# Altium footprint library Connectors.PcbLib: 245 footprints (part 14 of 18)
Each footprint in its own frame and in the unit in brackets; x right, y up, seen from the top. Pads: shape width x height; smd on the part's side, far side on the other; paste and mask are expansions set on the pad; w line width, h text height; cw(c..) or ccw(c..) is an arc to the next point about the centre after c.
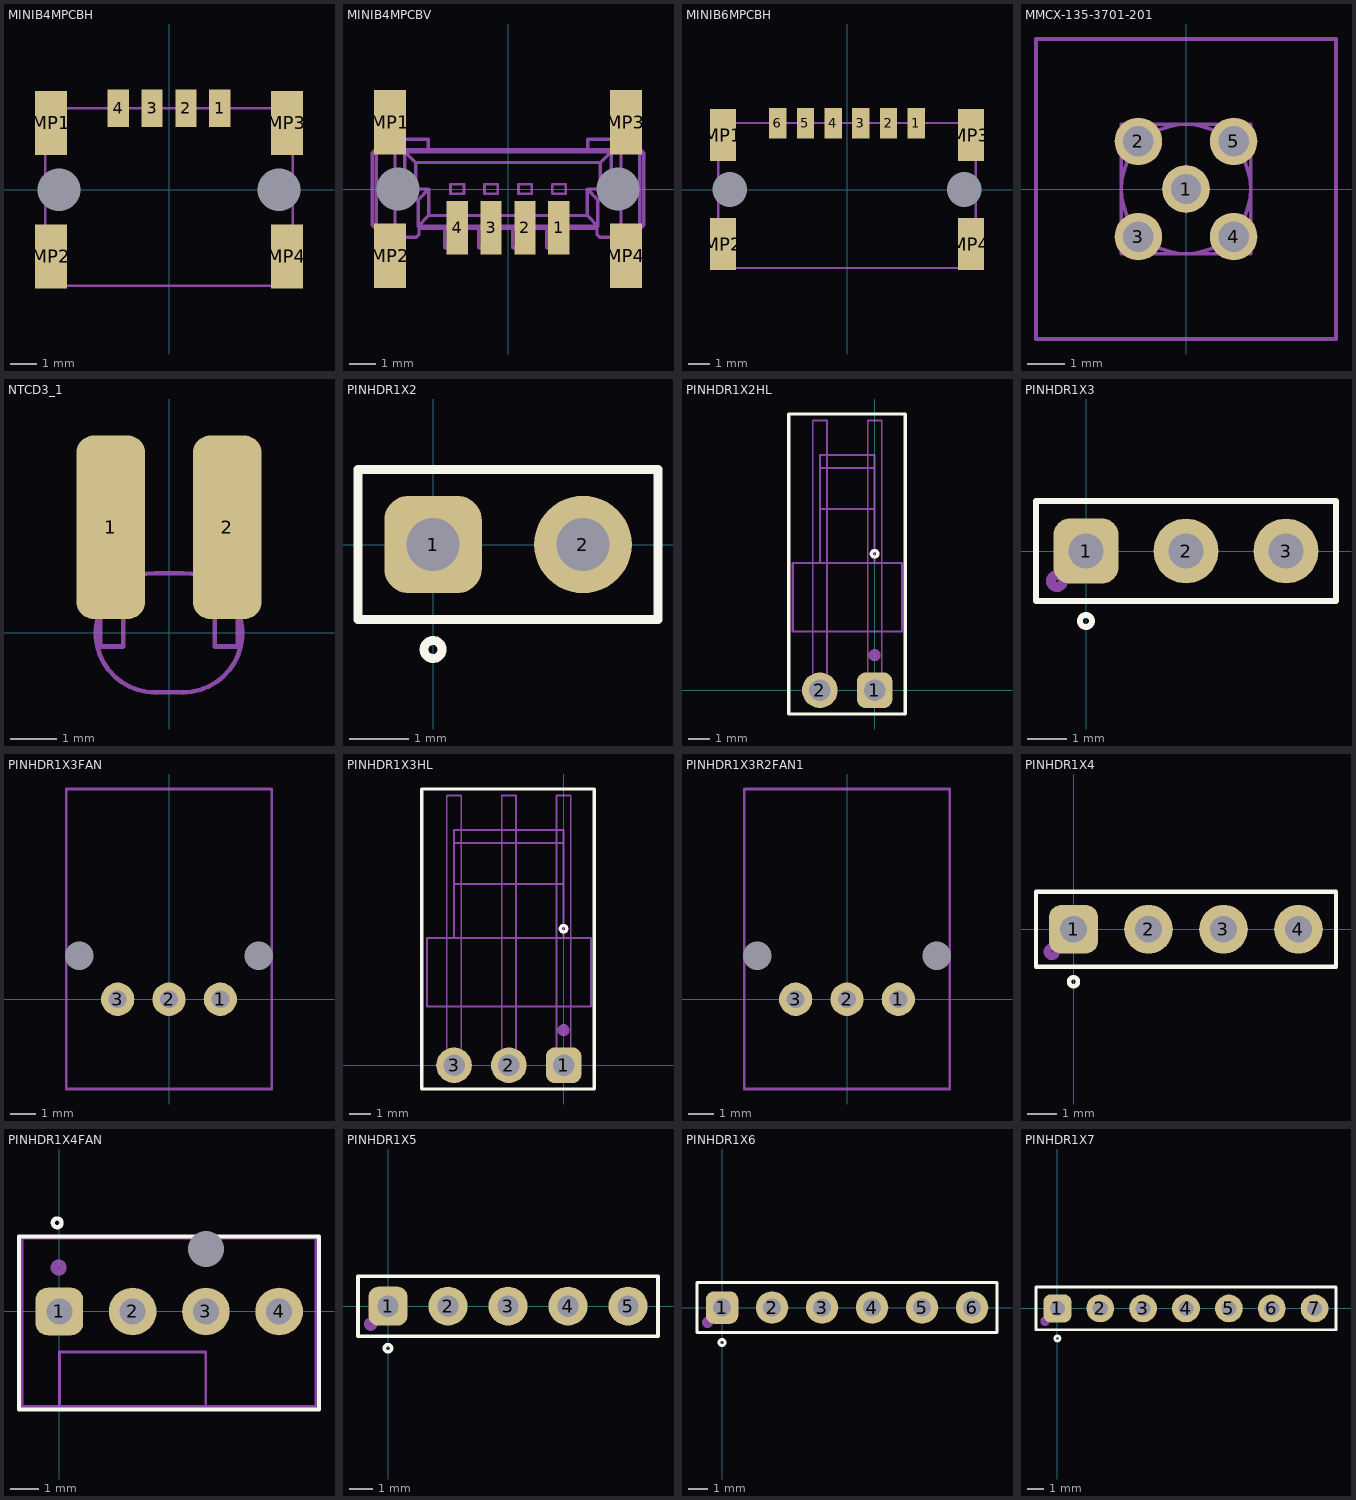
[diagram p13: the footprints below, top view; thin cyan lines are the x and y axes]

## MINIB4MPCBH [mm] "MiniBridge 4 pin MALE HORIZONTAL"
height 3
pads (10):
  rect 0.8x1.4 smd: 1(1.905,3.05) 2(0.635,3.05) 3(-0.635,3.05) 4(-1.905,3.05)
  rect 0x0 hole 1.6 unplated: MH1(-4.115,0) MH2(4.115,0)
  rect 1.2x2.4 smd: MP1(-4.415,2.5) MP2(-4.415,-2.5) MP3(4.415,2.5) MP4(4.415,-2.5)
Mechanical 13:
  lines w0.102: -4.635,-3.6 4.635,-3.6 4.635,3.05 -4.635,3.05 -4.635,-3.6
3D body: height 3, standoff -0.73, extent -5.08,-3.6 5.08,3.6

## MINIB4MPCBV [mm] "MiniBridge 4 pin MALE vertical"
height 8
pads (10):
  rect 0.8x2 smd: 1(1.905,-1.45) 2(0.635,-1.45) 3(-0.635,-1.45) 4(-1.905,-1.45)
  rect 0x0 hole 1.6 unplated: MH1(-4.115,0) MH2(4.115,0)
  rect 1.2x2.4 smd: MP1(-4.415,2.5) MP2(-4.415,-2.5) MP3(4.415,2.5) MP4(4.415,-2.5)
Mechanical 13:
  drawing of 218 lines, arcs and shapes, not listed
3D body: height 5.27, standoff -0.73, extent -5.08,-3.6 5.08,3.6

## MINIB6MPCBH [mm] "MiniBridge 6 pin MALE HORIZONTAL"
height 3
pads (12):
  rect 0.8x1.4 smd: 1(3.175,3.05) 2(1.905,3.05) 3(0.635,3.05) 4(-0.635,3.05) 5(-1.905,3.05) 6(-3.175,3.05)
  rect 0x0 hole 1.6 unplated: MH1(-5.385,0) MH2(5.385,0)
  rect 1.2x2.4 smd: MP1(-5.685,2.5) MP2(-5.685,-2.5) MP3(5.685,2.5) MP4(5.685,-2.5)
Mechanical 13:
  lines w0.102: -5.905,-3.6 -5.905,3.05 5.905,3.05 5.905,-3.6 -5.905,-3.6

## MMCX-135-3701-201 [mil] "MMCX Jack, PCB Vertical"
height 177
pads (5):
  round 50 hole 32: 1(0,0) 2(-50,50) 3(-50,-50) 4(50,-50) 5(50,50)
Mechanical 13:
  circle w20: c0,0 r10
  circle w4: c0,0 r68
  lines w3.94: -68,-68 68,-68 68,68 -68,68 -68,-68
Mechanical 15:
  lines w4: -21.65,0 21.65,0 ; 0,-23.62 0,23.62 ; -157.48,-157.48 157.48,-157.48 157.48,157.48 -157.48,157.48 -157.48,-157.48
3D body: height 177.65, standoff -117.63, extent -68.88,-68.89 68.91,68.91

## NTCD3_1 [mm] "NTC resistor SMD R2.54mm 2.4x3mm h 8mm"
height 8
pads (2):
  rrect50% 1.5x4 smd: 1(-1.27,2.3) 2(1.27,2.3)
Mechanical 13:
  lines w0.1: -0.3,-1.3 0.3,-1.3 ; -0.3,1.3 0.3,1.3
  lines w0.102: -0.3,-1.3 cw(c-0.3,0) -0.3,1.3 ; 0.3,-1.3 ccw(c0.3,0) 0.3,1.3 ; -1.5,-0.3 -1,-0.3 -1,3.7 -1.5,3.7 -1.5,-0.3 ; 1,-0.3 1,3.7 1.5,3.7 1.5,-0.3 1,-0.3
3D body: height 6, standoff 2, extent -1.611,-1.311 1.611,1.311
3D body: height 0.5, standoff 0, extent -1.5,-0.3 -1,3.7
3D body: height 0.5, standoff 0, extent 1,-0.3 1.5,3.7
3D body: height 2, standoff 0, extent -1.5,-0.3 -1,0.2
3D body: height 2, standoff 0, extent 1,-0.3 1.5,0.2

## PINHDR1X2 [mil] "Pin header 1x2 pin R2.54mm"
height 433.07
pads (2):
  rrect50% 65x65 hole 35.43 paste-50: 1(0,0)
  round 65 hole 35.43 paste-50: 2(100,0)
Top Overlay:
  circle w5.91: c0,-70 r6
  lines w5.91: -50,-50 -50,50 150,50 150,-50 -50,-50
Mechanical 13:
  lines w4: -50,-50 -50,50 150,50 150,-50 -50,-50 ; -13,-13 13,-13 13,13 -13,13 -13,-13 ; 87,-13 113,-13 113,13 87,13 87,-13
3D body: height 314.96, standoff -125.98, extent -13,-13 13,13
3D body: height 314.96, standoff -125.98, extent 87,-13 113,13
3D body: height 100, standoff 0, extent -50,-50 150,50

## PINHDR1X2HL [mil] "Pin header 1x2 pin R2.54mm Molex 22-05-3021"
height 250
pads (2):
  rrect50% 65x65 hole 39.37 paste-50: 1(0,0)
  round 65 hole 39.37 paste-50: 2(-100,0)
Top Overlay:
  circle w5.91: c-0.29,249.02 r6
  lines w5.91: -157,-43.31 55.91,-43.31 55.91,503.94 -157,503.94 -157,-43.31
Mechanical 13:
  circle w10: c-0.29,63.98 r6
  lines w3: -113,13 -113,492.13 -87,492.13 -87,13 ; -100,330.71 -0.2,330.71 ; -100,405.51 -0.2,405.51 ; -13,13 -13,492.13 13,492.13 13,13
  lines w4: -100,232.08 -100,429.13 -0.2,429.13 -0.2,232.08 ; -149.61,107.08 -149.61,232.08 49.61,232.08 49.61,107.08 -149.61,107.08 ; -113,-13 -113,13 -87,13 -87,-13 -113,-13 ; -13,-13 -13,13 13,13 13,-13 -13,-13
3D body: height 250, standoff 0, extent -149.61,107.08 49.61,232.08
3D body: height 135.04, standoff -140.94, extent -113,-13 -87,13
3D body: height 135.04, standoff -140.94, extent -13,-13 13,13
3D body: height 210.63, standoff 177.17, extent -100,330.71 -0.2,405.51
3D body: height 250, standoff 210.63, extent -100,232.08 -0.2,429.13
3D body: height 135.04, standoff 109.06, extent -113,13 -87,492.13
3D body: height 135.04, standoff 109.06, extent -13,13 13,492.13

## PINHDR1X3 [mil] "Pin header 1x3 pin R2.54mm"
height 433.07
pads (3):
  rrect50% 65x65 hole 35.43 paste-50: 1(0,0)
  round 65 hole 35.43 paste-50: 2(100,0) 3(200,0)
Top Overlay:
  circle w5.91: c0,-70 r6
  lines w5.91: -50,-50 250,-50 250,50 -50,50 -50,-50
Mechanical 13:
  circle w10: c-29,-30 r6
  lines w4: -50,-50 250,-50 250,50 -50,50 -50,-50 ; -13,-13 13,-13 13,13 -13,13 -13,-13 ; 87,-13 113,-13 113,13 87,13 87,-13 ; 187,-13 213,-13 213,13 187,13 187,-13
3D body: height 100, standoff 0, extent -50,-50 250,50
3D body: height 314.96, standoff -125.98, extent 87,-13 113,13
3D body: height 314.96, standoff -125.98, extent -13,-13 13,13
3D body: height 314.96, standoff -125.98, extent 187,-13 213,13

## PINHDR1X3FAN [mm] "Pin header 1x3 pin R2.0mm FAN"
height 7
pads (5):
  round 1.3 hole 0.7: 1(2,0) 2(0,0) 3(-2,0)
  round 0 hole 1.1 unplated mask+0.7: MH1(3.5,1.7) MH2(-3.5,1.7)
Mechanical 13:
  lines w0.102: -4,-3.5 -4,8.2 4,8.2 4,-3.5 -4,-3.5
3D body: height 2.5, standoff 0, extent -4,-3.5 4,8.2
3D body: height 6, standoff 2.5, extent -4,-0.584 4,8.2
3D body: height 6.5, standoff 6, extent -4,-0.584 4,8.2
3D body: height 4, standoff 3, extent -2.324,2.286 -1.689,7.62
3D body: height 4, standoff 3, extent -0.324,2.286 0.311,7.62
3D body: height 4, standoff 3, extent 1.676,2.286 2.311,7.62
3D body: height 0, standoff -3.4, extent -2.343,-0.337 -1.67,0.337
3D body: height 0, standoff -3.4, extent -0.343,-0.337 0.33,0.337
3D body: height 0, standoff -3.4, extent 1.657,-0.337 2.33,0.337
3D body: height 0, standoff -1.2, extent -4.01,1.184 -2.987,2.194

## PINHDR1X3HL [mil] "Pin header 1x3 pin R2.54mm Molex 22-05-3031"
height 250
pads (3):
  rrect50% 65x65 hole 39.37 paste-50: 1(0,0)
  round 65 hole 39.37 paste-50: 2(-100,0) 3(-200,0)
Top Overlay:
  circle w5.91: c-0.29,249.02 r6
  lines w5.91: -259.06,-43.31 55.91,-43.31 55.91,503.94 -259.06,503.94 -259.06,-43.31
Mechanical 13:
  circle w10: c-0.29,63.98 r6
  lines w3: -213,13 -213,492.13 -187,492.13 -187,13 ; -200,330.71 -0.2,330.71 ; -200,405.51 -0.2,405.51 ; -113,13 -113,492.13 -87,492.13 -87,13 ; -13,13 -13,492.13 13,492.13 13,13
  lines w4: -200,232.08 -200,429.13 -0.2,429.13 -0.2,232.08 ; -249.61,107.08 -249.61,232.08 49.61,232.08 49.61,107.08 -249.61,107.08 ; -213,-13 -213,13 -187,13 -187,-13 -213,-13 ; -113,-13 -113,13 -87,13 -87,-13 -113,-13 ; -13,-13 -13,13 13,13 13,-13 -13,-13
3D body: height 250, standoff 0, extent -249.61,107.08 49.61,232.08
3D body: height 135.04, standoff -140.94, extent -113,-13 -87,13
3D body: height 135.04, standoff -140.94, extent -213,-13 -187,13
3D body: height 135.04, standoff -140.94, extent -13,-13 13,13
3D body: height 210.63, standoff 177.17, extent -200,330.71 -0.2,405.51
3D body: height 250, standoff 210.63, extent -200,232.08 -0.2,429.13
3D body: height 135.04, standoff 109.06, extent -213,13 -187,492.13
3D body: height 135.04, standoff 109.06, extent -113,13 -87,492.13
3D body: height 135.04, standoff 109.06, extent -13,13 13,492.13

## PINHDR1X3R2FAN1 [mm] "Pin header 1x3 pin R2.0mm FAN"
height 7.7
pads (5):
  round 1.3 hole 0.7: 1(2,0) 2(0,0) 3(-2,0)
  round 0 hole 1.1 unplated mask+0.7: MH1(3.5,1.7) MH2(-3.5,1.7)
Mechanical 13:
  lines w0.102: -4,-3.5 -4,8.2 4,8.2 4,-3.5 -4,-3.5
3D body: height 2.5, standoff 0, extent -4,-3.5 4,8.2
3D body: height 6, standoff 2.5, extent -4,-0.584 4,8.2
3D body: height 6.5, standoff 6, extent -4,-0.584 4,8.2
3D body: height 4, standoff 3, extent -2.324,2.286 -1.689,7.62
3D body: height 4, standoff 3, extent -0.324,2.286 0.311,7.62
3D body: height 4, standoff 3, extent 1.676,2.286 2.311,7.62
3D body: height 0, standoff -3.4, extent -2.343,-0.337 -1.67,0.337
3D body: height 0, standoff -3.4, extent -0.343,-0.337 0.33,0.337
3D body: height 0, standoff -3.4, extent 1.657,-0.337 2.33,0.337
3D body: height 0, standoff -1.2, extent -4.01,1.184 -2.987,2.194

## PINHDR1X4 [mil] "Pin header 1x4 pin R2.54mm"
height 433.07
pads (4):
  rrect50% 65x65 hole 35.43 paste-50: 1(0,0)
  round 65 hole 35.43 paste-50: 2(100,0) 3(200,0) 4(300,0)
Top Overlay:
  circle w5.91: c0,-70 r6
  lines w5.91: -50,-50 350,-50 350,50 -50,50 -50,-50
Mechanical 13:
  circle w10: c-29,-30 r6
  lines w4: -50,-50 350,-50 350,50 -50,50 -50,-50 ; -13,-13 -13,13 13,13 13,-13 -13,-13 ; 87,-13 87,13 113,13 113,-13 87,-13 ; 187,-13 187,13 213,13 213,-13 187,-13 ; 287,-13 287,13 313,13 313,-13 287,-13
3D body: height 100, standoff 0, extent -50,-50 350,50
3D body: height 314.96, standoff -125.98, extent 87,-13 113,13
3D body: height 314.96, standoff -125.98, extent -13,-13 13,13
3D body: height 314.96, standoff -125.98, extent 187,-13 213,13
3D body: height 314.96, standoff -125.98, extent 287,-13 313,13

## PINHDR1X4FAN [mil] "Pin header 1x4 pin R2.54mm Molex 47053-1000"
height 393.7
pads (5):
  rrect50% 65x65 hole 35.43 paste-50: 1(0,0)
  round 65 hole 35.43 paste-50: 2(100,0) 3(200,0) 4(300,0)
  round 0 hole 49.21 unplated mask+39.37: MH1(200,85.04)
Top Overlay:
  circle w5.91: c-3,121 r6
  lines w5.91: -55.12,-133.86 -55.12,102.36 354.33,102.36 354.33,-133.86 -55.12,-133.86
Mechanical 13:
  circle w10: c-1,60 r6
  lines w4: 0,-129.92 0,-55.12 199.8,-55.12 199.8,-129.92 ; -51.18,-129.92 -51.18,100.39 350.39,100.39 350.39,-129.92 -51.18,-129.92 ; -13,-13 13,-13 13,13 -13,13 -13,-13 ; 87,-13 113,-13 113,13 87,13 87,-13 ; 187,-13 213,-13 213,13 187,13 187,-13 ; 287,-13 313,-13 313,13 287,13 287,-13
  lines w5: 188.48,99.77 ccw(c200,85.04) 211.76,99.58
3D body: height 291.34, standoff 216.54, extent 0,-129.92 199.8,-55.12
3D body: height 393.7, standoff -137.8, extent 287,-13 313,13
3D body: height 393.7, standoff -137.8, extent 187,-13 213,13
3D body: height 393.7, standoff -137.8, extent -13,-13 13,13
3D body: height 393.7, standoff -137.8, extent 87,-13 113,13
3D body: height 100, standoff 0, extent -51.18,-129.92 350.39,100.39
3D body: height 0, standoff -90.55, extent 181,65.94 219,100.39
3D body: height 216.54, standoff 98.43, extent 0,-129.92 199.8,-94.49

## PINHDR1X5 [mil] "Pin header 1x6 pin R2.54mm"
height 433.07
pads (5):
  rrect50% 65x65 hole 35.43 paste-50: 1(0,0)
  round 65 hole 35.43 paste-50: 2(100,0) 3(200,0) 4(300,0) 5(400,0)
Top Overlay:
  circle w5.91: c0,-70 r6
  lines w5.91: -50,-50 -50,50 450,50 450,-50 -50,-50
Mechanical 13:
  circle w10: c-29,-30 r6
  lines w4: -50,-50 -50,50 450,50 450,-50 -50,-50 ; -13,-13 -13,13 13,13 13,-13 -13,-13 ; 87,-13 87,13 113,13 113,-13 87,-13 ; 187,-13 187,13 213,13 213,-13 187,-13 ; 287,-13 287,13 313,13 313,-13 287,-13 ; 387,-13 387,13 413,13 413,-13 387,-13
3D body: height 314.96, standoff -125.98, extent 387,-13 413,13
3D body: height 314.96, standoff -125.98, extent 287,-13 313,13
3D body: height 314.96, standoff -125.98, extent 187,-13 213,13
3D body: height 314.96, standoff -125.98, extent -13,-13 13,13
3D body: height 314.96, standoff -125.98, extent 87,-13 113,13
3D body: height 100, standoff 0, extent -50,-50 450,50

## PINHDR1X6 [mil] "Pin header 1x6 pin R2.54mm"
height 433.07
pads (6):
  rrect50% 65x65 hole 35.43 paste-50: 1(0,0)
  round 65 hole 35.43 paste-50: 2(100,0) 3(200,0) 4(300,0) 5(400,0) 6(500,0)
Top Overlay:
  circle w5.91: c0,-70 r6
  lines w5.91: -50,-50 -50,50 550,50 550,-50 -50,-50
Mechanical 13:
  circle w10: c-29,-30 r6
  lines w4: -50,-50 -50,50 550,50 550,-50 -50,-50 ; -13,-13 13,-13 13,13 -13,13 -13,-13 ; 87,-13 113,-13 113,13 87,13 87,-13 ; 187,-13 213,-13 213,13 187,13 187,-13 ; 287,-13 313,-13 313,13 287,13 287,-13 ; 387,-13 413,-13 413,13 387,13 387,-13 ; 487,-13 513,-13 513,13 487,13 487,-13
3D body: height 314.96, standoff -125.98, extent 387,-13 413,13
3D body: height 314.96, standoff -125.98, extent 487,-13 513,13
3D body: height 314.96, standoff -125.98, extent 287,-13 313,13
3D body: height 314.96, standoff -125.98, extent 187,-13 213,13
3D body: height 314.96, standoff -125.98, extent -13,-13 13,13
3D body: height 314.96, standoff -125.98, extent 87,-13 113,13
3D body: height 100, standoff 0, extent -50,-50 550,50

## PINHDR1X7 [mil] "Pin header 1x7 pin R2.54mm"
height 433.07
pads (7):
  rrect50% 65x65 hole 35.43 paste-50: 1(0,0)
  round 65 hole 35.43 paste-50: 2(100,0) 3(200,0) 4(300,0) 5(400,0) 6(500,0) 7(600,0)
Top Overlay:
  circle w5.91: c0,-70 r6
  lines w5.91: -50,-50 650,-50 650,50 -50,50 -50,-50
Mechanical 13:
  circle w10: c-29,-30 r6
  lines w4: -50,-50 650,-50 650,50 -50,50 -50,-50 ; -13,-13 -13,13 13,13 13,-13 -13,-13 ; 87,-13 87,13 113,13 113,-13 87,-13 ; 187,-13 187,13 213,13 213,-13 187,-13 ; 287,-13 287,13 313,13 313,-13 287,-13 ; 387,-13 387,13 413,13 413,-13 387,-13 ; 487,-13 487,13 513,13 513,-13 487,-13 ; 587,-13 587,13 613,13 613,-13 587,-13
3D body: height 314.96, standoff -125.98, extent 587,-13 613,13
3D body: height 100, standoff 0, extent -50,-50 650,50
3D body: height 314.96, standoff -125.98, extent 87,-13 113,13
3D body: height 314.96, standoff -125.98, extent -13,-13 13,13
3D body: height 314.96, standoff -125.98, extent 187,-13 213,13
3D body: height 314.96, standoff -125.98, extent 287,-13 313,13
3D body: height 314.96, standoff -125.98, extent 487,-13 513,13
3D body: height 314.96, standoff -125.98, extent 387,-13 413,13